# Altium schematic symbol library AA_Symbols.SchLib: 1017 symbols (part 5 of 7)
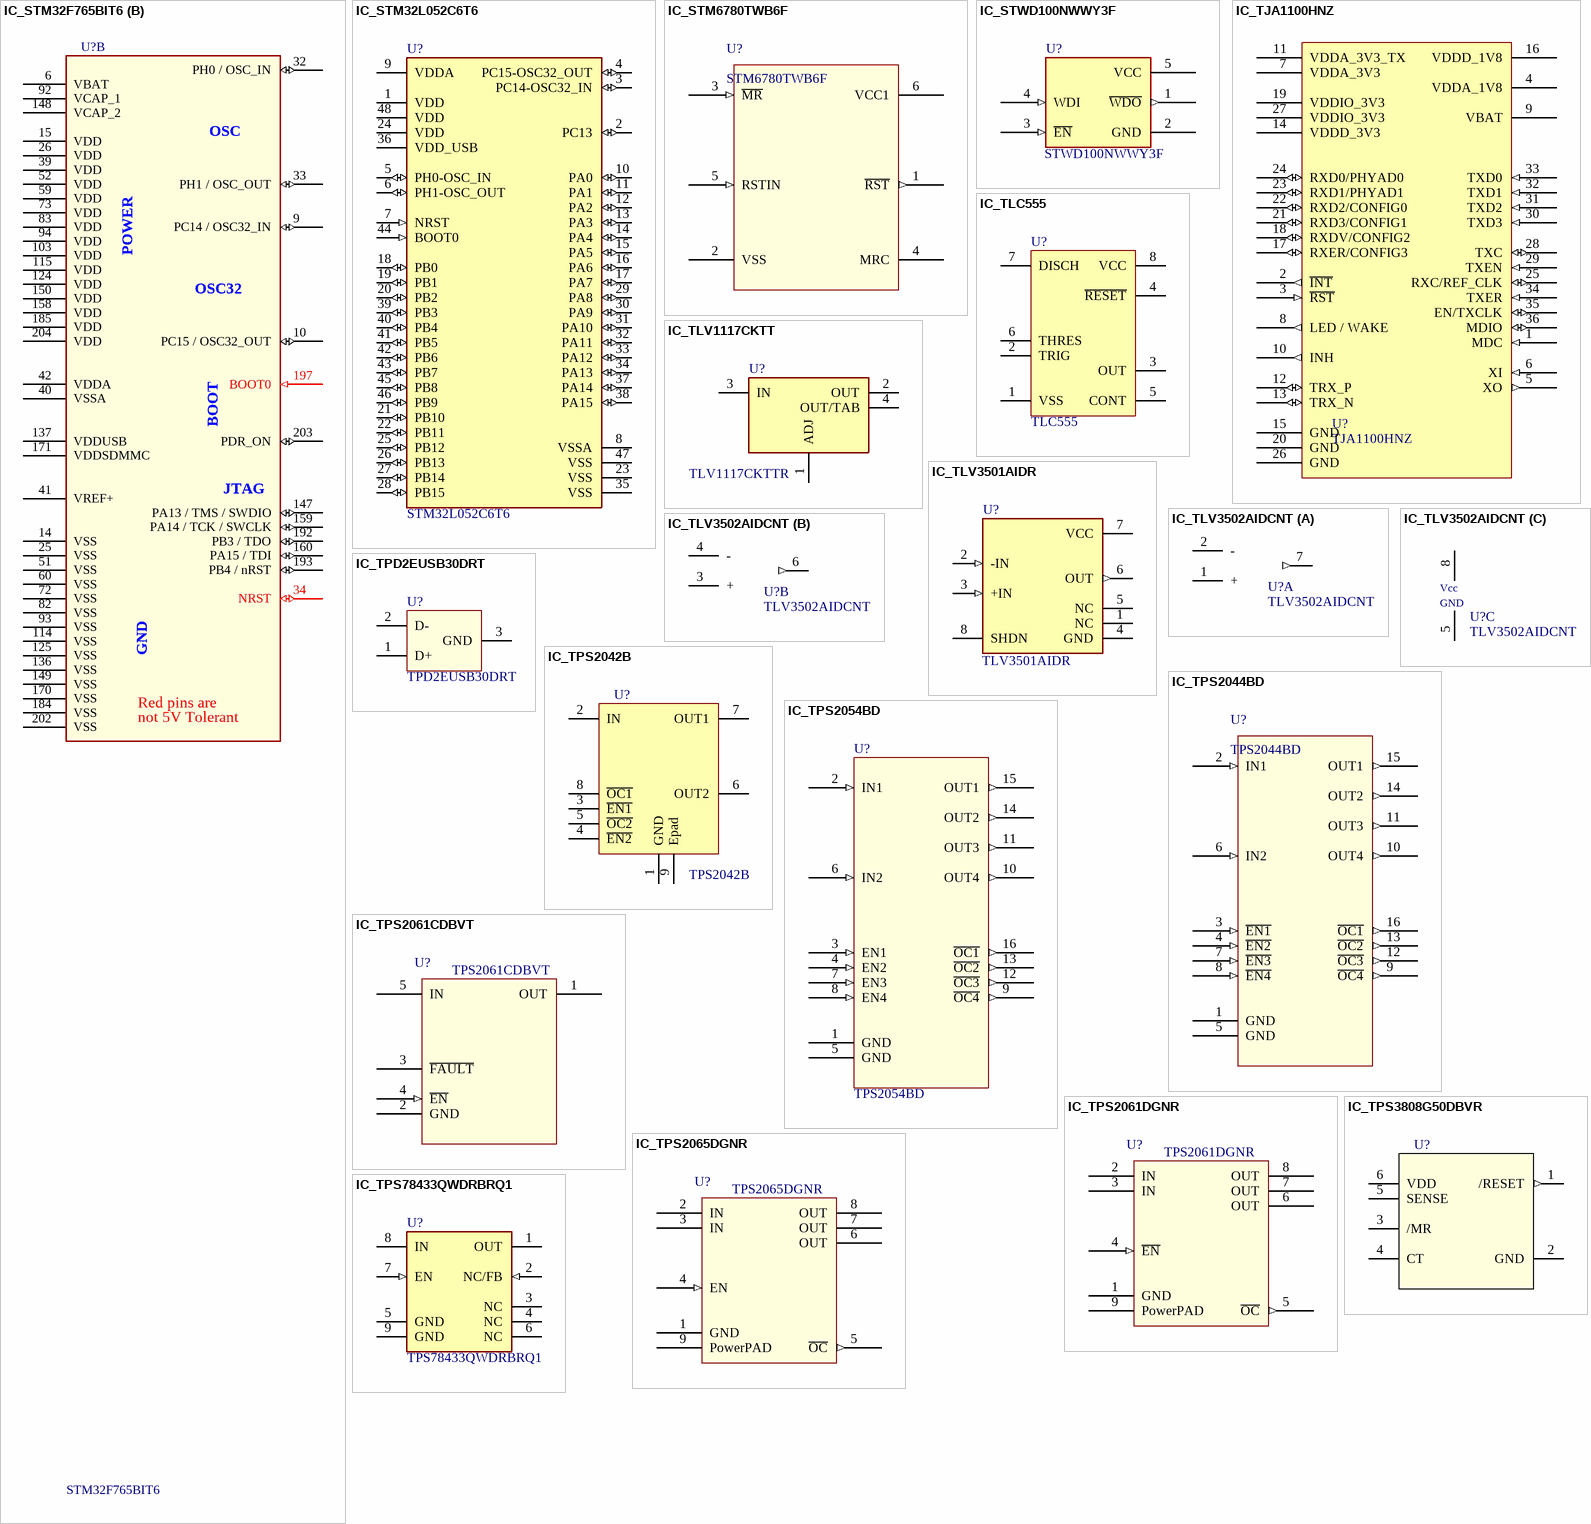
[diagram p46: symbols IC_STM32F765BIT6 to IC_TPS78433QWDRBRQ1]

## IC_STM32F765BIT6
designator U?, comment STM32F765BIT6
IC, STM32 ARM-based 32-bit MCU with 2MB Flash, 208LQFP, STM32F765BIT6; Manufacturer: STMicroelectronics; Outset P/N: PN-0006882; Manufacturer P/N: STM32F765BIT6; VALUE: STM32F765BIT6
footprint QFP208P50_3000X3000X160L60X22N
part A pins: 1 PE2 (io), 2 PE3 (io), 3 PE4 (io), 4 PE5 (io), 5 PE6 (io), 7 PI8 (io), 8 PC13 (io), 11 PI9 (io), 12 PI10 (io), 13 PI11 (io), 16 PF0 (io), 17 PF1 (io), 18 PF2 (io), 19 PI12 (io), 20 PI13 (io), 21 PI14 (io), 22 PF3 (io), 23 PF4 (io), 24 PF5 (io), 27 PF6 (io), 28 PF7 (io), 29 PF8 (io), 30 PF9 (io), 31 PF10 (io), 35 PC0 (io), 36 PC1 (io), 37 PC2 (io), 38 PC3 (io), 43 PA0 (io), 44 PA1 (io), 45 PA2 (io), 46 PH2 (io), 47 PH3 (io), 48 PH4 (io), 49 PH5 (io), 50 PA3 (io), 53 PA4 (io), 54 PA5 (io), 55 PA6 (io), 56 PA7 (io), 57 PC4 (io), 58 PC5 (io), 61 PB0 (io), 62 PB1 (io), 63 PB2 (io), 64 PI15 (io), 65 PJ0 (io), 66 PJ1 (io), 67 PJ2 (io), 68 PJ3 (io), 69 PJ4 (io), 70 PF11 (io), 71 PF12 (io), 74 PF13 (io), 75 PF14 (io), 76 PF15 (io), 77 PG0 (io), 78 PG1 (io), 79 PE7 (io), 80 PE8 (io), 81 PE9 (io), 84 PE10 (io), 85 PE11 (io), 86 PE12 (io), 87 PE13 (io), 88 PE14 (io), 89 PE15 (io), 90 PB10 (io), 91 PB11 (io), 95 PJ5 (io), 96 PH6 (io), 97 PH7 (io), 98 PH8 (io), 99 PH9 (io), 100 PH10 (io), 101 PH11 (io), 102 PH12 (io), 104 PB12 (io), 105 PB13 (io), 106 PB14 (io), 107 PB15 (io), 108 PD8 (io), 109 PD9 (io), 110 PD10 (io), 111 PD11 (io), 112 PD12 (io), 113 PD13 (io), 116 PD14 (io), 117 PD15 (io), 118 PJ6 (io), 119 PJ7 (io), 120 PJ8 (io), 121 PJ9 (io), 122 PJ10 (io), 123 PJ11 (io), 126 PK0 (io), 127 PK1 (io), 128 PK2 (io), 129 PG2 (io), 130 PG3 (io), 131 PG4 (io), 132 PG5 (io), 133 PG6 (io), 134 PG7 (io), 135 PG8 (io), 138 PC6 (io), 139 PC7 (io), 140 PC8 (io), 141 PC9 (io), 142 PA8 (io), 143 PA9 (io), 144 PA10 (io), 145 PA11 (io), 146 PA12 (io), 151 PH13 (io), 152 PH14 (io), 153 PH15 (io), 154 PI0 (io), 155 PI1 (io), 156 PI2 (io), 157 PI3 (io), 161 PC10 (io), 162 PC11 (io), 163 PC12 (io), 164 PD0 (io), 165 PD1 (io), 166 PD2 (io), 167 PD3 (io), 168 PD4 (io), 169 PD5 (io), 172 PD6 (io), 173 PD7 (io), 174 PJ12 (io), 175 PJ13 (io), 176 PJ14 (io), 177 PJ15 (io), 178 PG9 (io), 179 PG10 (io), 180 PG11 (io), 181 PG12 (io), 182 PG13 (io), 183 PG14 (io), 186 PK3 (io), 187 PK4 (io), 188 PK5 (io), 189 PK6 (io), 190 PK7 (io), 191 PG15 (io), 194 PB5 (io), 195 PB6 (io), 196 PB7 (io), 198 PB8 (io), 199 PB9 (io), 200 PE0 (io), 201 PE1 (io), 205 PI4 (io), 206 PI5 (io), 207 PI6 (io), 208 PI7 (io)
part B pins: 6 VBAT (power), 9 PC14 / OSC32_IN (io), 10 PC15 / OSC32_OUT (io), 14 VSS (power), 15 VDD (power), 25 VSS (power), 26 VDD (power), 32 PH0 / OSC_IN (io), 33 PH1 / OSC_OUT (io), 34 NRST (io), 39 VDD (power), 40 VSSA (power), 41 VREF+ (power), 42 VDDA (power), 51 VSS (power), 52 VDD (power), 59 VDD (power), 60 VSS (power), 72 VSS (power), 73 VDD (power), 82 VSS (power), 83 VDD (power), 92 VCAP_1 (power), 93 VSS (power), 94 VDD (power), 103 VDD (power), 114 VSS (power), 115 VDD (power), 124 VDD (power), 125 VSS (power), 136 VSS (power), 137 VDDUSB (power), 147 PA13 / TMS / SWDIO (io), 148 VCAP_2 (power), 149 VSS (power), 150 VDD (power), 158 VDD (power), 159 PA14 / TCK / SWCLK (io), 160 PA15 / TDI (io), 170 VSS (power), 171 VDDSDMMC (power), 184 VSS (power), 185 VDD (power), 192 PB3 / TDO (io), 193 PB4 / nRST (io), 197 BOOT0 (in), 202 VSS (power), 203 PDR_ON (io), 204 VDD (power)
part A text: Red pins are; not 5V Tolerant
part B text: OSC; POWER; OSC32; BOOT; JTAG; GND; Red pins are; not 5V Tolerant

## IC_STM32L052C6T6
designator U?, comment STM32L052C6T6
IC MCU 32BIT 32KB FLASH 48LQFP; Manufacturer: STMicro; Outset P/N: PN-0007909; TEMPERATURE: -40°C ~ 85°C; Manufacturer P/N: STM32L052C6T6; VALUE: STM32L052C6T6
footprint QFP48P50_900X900X160L60X22N
pins: 1 VDD (power), 2 PC13 (io), 3 PC14-OSC32_IN (io), 4 PC15-OSC32_OUT (io), 5 PH0-OSC_IN (io), 6 PH1-OSC_OUT (io), 7 NRST (in), 8 VSSA (power), 9 VDDA (power), 10 PA0 (io), 11 PA1 (io), 12 PA2 (io), 13 PA3 (io), 14 PA4 (io), 15 PA5 (io), 16 PA6 (io), 17 PA7 (io), 18 PB0 (io), 19 PB1 (io), 20 PB2 (io), 21 PB10 (io), 22 PB11 (io), 23 VSS (power), 24 VDD (power), 25 PB12 (io), 26 PB13 (io), 27 PB14 (io), 28 PB15 (io), 29 PA8 (io), 30 PA9 (io), 31 PA10 (io), 32 PA11 (io), 33 PA12 (io), 34 PA13 (io), 35 VSS (power), 36 VDD_USB (power), 37 PA14 (io), 38 PA15 (io), 39 PB3 (io), 40 PB4 (io), 41 PB5 (io), 42 PB6 (io), 43 PB7 (io), 44 BOOT0 (in), 45 PB8 (io), 46 PB9 (io), 47 VSS (power), 48 VDD (power)

## IC_STM6780TWB6F
designator U?, comment STM6780TWB6F
IC, Dual Voltage Monitor Supervisor, STM6780TWB6F, SOT23-6; Manufacturer: STMicroelectronics; Outset P/N: PN-0001653; Value: STM6780TWB6F; Manufacturer P/N: STM6780TWB6F
footprint STM6780TWB6F_SOT95P280X145-6L30N (Small Outline Transistor (SOT23), 0.95 mm pitch; 6 pin, 2.9 mm L X 1.6 mm W X 1.45 mm H body)
pins: 1 ~{RST} (out), 2 VSS (power), 3 ~{MR} (in), 4 MRC, 5 RSTIN (in), 6 VCC1 (power)

## IC_STWD100NWWY3F
designator U?, comment STWD100NWWY3F
IC, Supervisory Circuits Watchdog Timer, 1 CH, SOT23-5; Manufacturer: STMicroelectronics; Outset P/N: PN-0007146; Manufacturer P/N: STWD100NWWY3F; VALUE: STWD100NWWY3F
footprint SOT23-5P95_280X145L45X40N (527AH_MO-178)
pins: 1 ~{WDO} (out), 2 GND, 3 ~{EN} (in), 4 WDI (in), 5 VCC (power)

## IC_TJA1100HNZ
designator U?, comment TJA1100HNZ
IC, Transceiver Full Ethernet 36-HVQFN (6x6); Manufacturer: NXP USA Inc.; Manufacturer P/N: TJA1100HNZ
pins: 1 MDC (in), 2 ~{INT} (out), 3 ~{RST} (in), 4 VDDA_1V8 (power), 5 XO (out), 6 XI (in), 7 VDDA_3V3 (power), 8 LED / WAKE (out), 9 VBAT (power), 10 INH (out), 11 VDDA_3V3_TX (power), 12 TRX_P (io), 13 TRX_N (io), 14 VDDD_3V3 (power), 15 GND (power), 16 VDDD_1V8 (power), 17 RXER/CONFIG3 (io), 18 RXDV/CONFIG2 (io), 19 VDDIO_3V3 (power), 20 GND (power), 21 RXD3/CONFIG1 (io), 22 RXD2/CONFIG0 (io), 23 RXD1/PHYAD1 (io), 24 RXD0/PHYAD0 (io), 25 RXC/REF_CLK (io), 26 GND (power), 27 VDDIO_3V3 (power), 28 TXC (io), 29 TXEN (in), 30 TXD3 (in), 31 TXD2 (in), 32 TXD1 (in), 33 TXD0 (in), 34 TXER (in), 35 EN/TXCLK (io), 36 MDIO (io)

## IC_TLC555
designator U?, comment TLC555
IC, 555 timer, LinCMOS; Manufacturer: Texas Instruments; Manufacturer P/N: TLC555IDR; Outset P/N: 0000166
footprint SO-8N (SO8 8Pin)
pins: 1 VSS "CH A", 2 TRIG "VCC", 3 OUT "Mode", 4 ~{RESET} "Clock", 5 CONT "GND", 6 THRES "CH B", 7 DISCH "Up/Down", 8 VCC "BIAS"

## IC_TLV1117CKTT
designator U?, comment TLV1117CKTTR
IC, LDO Voltage Regulator Output 800mA Adj; Manufacturer: Texas Instruments; Outset P/N: PN-0007408; VALUE: TLV1117CKTTR; Manufacturer P/N: TLV1117CKTTR
footprint TO254P1524X445-4N (DDPAK_TO-263AA) (TO,2.54mm pitch; 2pin,15.24mm L X 10.16mm W X 4.45mm H body)
pins: 1 ADJ, 2 OUT (power), 3 IN (power), 4 OUT/TAB (power)

## IC_TLV3501AIDR
designator U?, comment TLV3501AIDR
IC, Comparator, 4.5ns, R-R Hi-Speed, 8-SOIC; Manufacturer: Texas Instruments; Outset P/N: PN-0007137; Manufacturer P/N: TLV3501AIDR; VALUE: TLV3501AIDR
footprint SOIC8P127_490X599X175L84X41N (D_MS-012AA)
pins: 1 NC, 2 -IN (in), 3 +IN (in), 4 GND (power), 5 NC, 6 OUT (out), 7 VCC (power), 8 SHDN

## IC_TLV3502AIDCNT
designator U?, comment TLV3502AIDCNT
IC, Comparator, Dual, Rail-to-Rail; Manufacturer: Texas Instruments; Outset P/N: 0000167; Manufacturer P/N: TLV3502AIDCNT
footprint SOT23_8PIN (SOT23, 8-Leads, Body 3.0x1.8mm (max), Pitch 0.65mm, IPC Medium Density)
part A pins: 1 +, 2 -, 7 OUT A (out)
part B pins: 3 +, 4 -, 6 OUT B (out)
part C pins: 5 Vcc- (power), 8 (power)
part C text: Vcc; GND

## IC_TPD2EUSB30DRT
designator U?, comment TPD2EUSB30DRT
IC, Diode, ESD Protection, USB, Dual; Manufacturer: Texas Instruments; Manufacturer P/N: TPD2EUSB30DRTR; Outset P/N: 0000168
footprint SOT-3
pins: 1 D+, 2 D-, 3 GND

## IC_TPS2042B
designator U?, comment TPS2042B
IC, Power Distribution Switch Dual; Manufacturer: Texas Instruments; Manufacturer P/N: TPS2042BDGNR; Outset P/N: 0000169
footprint MSOP_8PIN - PowerPad (MSOP, 8-Leads, Body 3.1x3.1mm (max), Pitch 0.65mm, IPC Medium Density)
pins: 1 GND, 2 IN, 3 ~{EN1}, 4 ~{EN2}, 5 ~{OC2}, 6 OUT2, 7 OUT1, 8 ~{OC1}, 9 Epad

## IC_TPS2044BD
designator U?, comment TPS2044BD
IC, Quad Power Distribution Switch, TPS2044BD, 16-SOIC; Manufacturer: Texas Instruments; Outset P/N: PN-0001654; Value: TPS2044BD; Manufacturer P/N: TPS2044BD
footprint TPS2044BD_SOIC127P600X175-8L87N (SOIC, 16-Leads, Body 9.90x3.90mm, Pitch 1.27mm, IPC Medium Density)
pins: 1 GND (power), 2 IN1 (in), 3 ~{EN1} (in), 4 ~{EN2} (in), 5 GND (power), 6 IN2 (in), 7 ~{EN3} (in), 8 ~{EN4} (in), 9 ~{OC4} (out), 10 OUT4 (out), 11 OUT3 (out), 12 ~{OC3} (out), 13 ~{OC2} (out), 14 OUT2 (out), 15 OUT1 (out), 16 ~{OC1} (out)

## IC_TPS2054BD
designator U?, comment TPS2054BD
IC, Quad Power Distribution Switch, TPS2054BD, 16-SOIC; Manufacturer: Texas Instruments; Manufacturer P/N: TPS2054BD; Value: TPS2054BD
footprint TPS2054BD_SOIC127P600X175-8L87N (Footprint not found)
pins: 1 GND (power), 2 IN1 (in), 3 EN1 (in), 4 EN2 (in), 5 GND (power), 6 IN2 (in), 7 EN3 (in), 8 EN4 (in), 9 ~{OC4} (out), 10 OUT4 (out), 11 OUT3 (out), 12 ~{OC3} (out), 13 ~{OC2} (out), 14 OUT2 (out), 15 OUT1 (out), 16 ~{OC1} (out)

## IC_TPS2061CDBVT
designator U?, comment TPS2061CDBVT
IC, Power Switch/Driver 1:1 N-Channel 1A SOT-23-5; Manufacturer: Texas Instruments; Outset P/N: PN-0008278; Value: TPS2061CDBVT; Manufacturer P/N: TPS2061CDBVT
footprint SOT23-5P95_280X145L45X40N (Small Outline Transistor, SOT-23 Type, 0.95 mm pitch; 5 pin, 2.90 mm L X 1.60 mm W X 1.45 mm H body)
pins: 1 OUT (power), 2 GND (power), 3 ~{FAULT} (power), 4 ~{EN} (in), 5 IN (power)

## IC_TPS2061DGNR
designator U?, comment TPS2061DGNR
IC, Single Power Distribution Switch 80mOhm, TPS2061DGNR, 8-MSOP; Manufacturer: Texas Instruments; Outset P/N: PN-0001655; Value: TPS2061DGNR; Manufacturer P/N: TPS2061DGNR
footprint TPS2061D_SOP65P490X110-8L30N (Plastic Small Outline Pkg (SOP with Tab), 0.65 mm pitch; 8 pin, 3.00 mm L X 3.00 mm W X 1.10 mm H body)
pins: 1 GND (power), 2 IN (power), 3 IN (power), 4 ~{EN} (in), 5 ~{OC} (out), 6 OUT (power), 7 OUT (power), 8 OUT (power), 9 PowerPAD

## IC_TPS2065DGNR
designator U?, comment TPS2065DGNR
IC, Single Power Distribution Switch 80mOhm, TPS2065DGNR, 8-MSOP; Manufacturer: Texas Instruments; Outset P/N: PN-0002777; Value: TPS2065DGNR; Manufacturer P/N: TPS2065DGNR
footprint TPS2065D_SOP65P490X110-8L30N (Footprint not found)
pins: 1 GND (power), 2 IN (power), 3 IN (power), 4 EN (in), 5 ~{OC} (out), 6 OUT (power), 7 OUT (power), 8 OUT (power), 9 PowerPAD

## IC_TPS3808G50DBVR
designator U?, comment TPS3808G50DBVR  (value not drawn)
IC, Power Monitor, TPS3808G50DBVR, SOT-23; Manufacturer: Texas Instruments; Outset P/N: PN-0001726; ClassName: *; Manufacturer P/N: TPS3808G50DBVR; NOSTUFF: *; Value: TPS3808G50DBVR
footprint MAX4173TEUT+T_SOT95P280X145-6L25N (Small Outline Transistor (SOT23), 0.95 mm pitch; 6 pin, 2.90 mm L X 1.625 mm W X 1.45 mm H body)
pins: 1 /RESET (out), 2 GND (power), 3 /MR, 4 CT, 5 SENSE, 6 VDD (power)

## IC_TPS78433QWDRBRQ1
designator U?, comment TPS78433QWDRBRQ1
IC, POS LDO, 3.3V FIXED, 300MA, 8-SON; Manufacturer: TI; Outset P/N: PN-0008342; TEMPERATURE: -40°C~ 150°C; Manufacturer P/N: TPS78433QWDRBRQ1; VALUE: TPS78433QWDRBRQ1
footprint TPS78433QWDRBRQ1
pins: 1 OUT (power), 2 NC/FB (in), 3 NC (hiz), 4 NC (hiz), 5 GND (power), 6 NC (hiz), 7 EN (in), 8 IN (power), 9 GND (power)

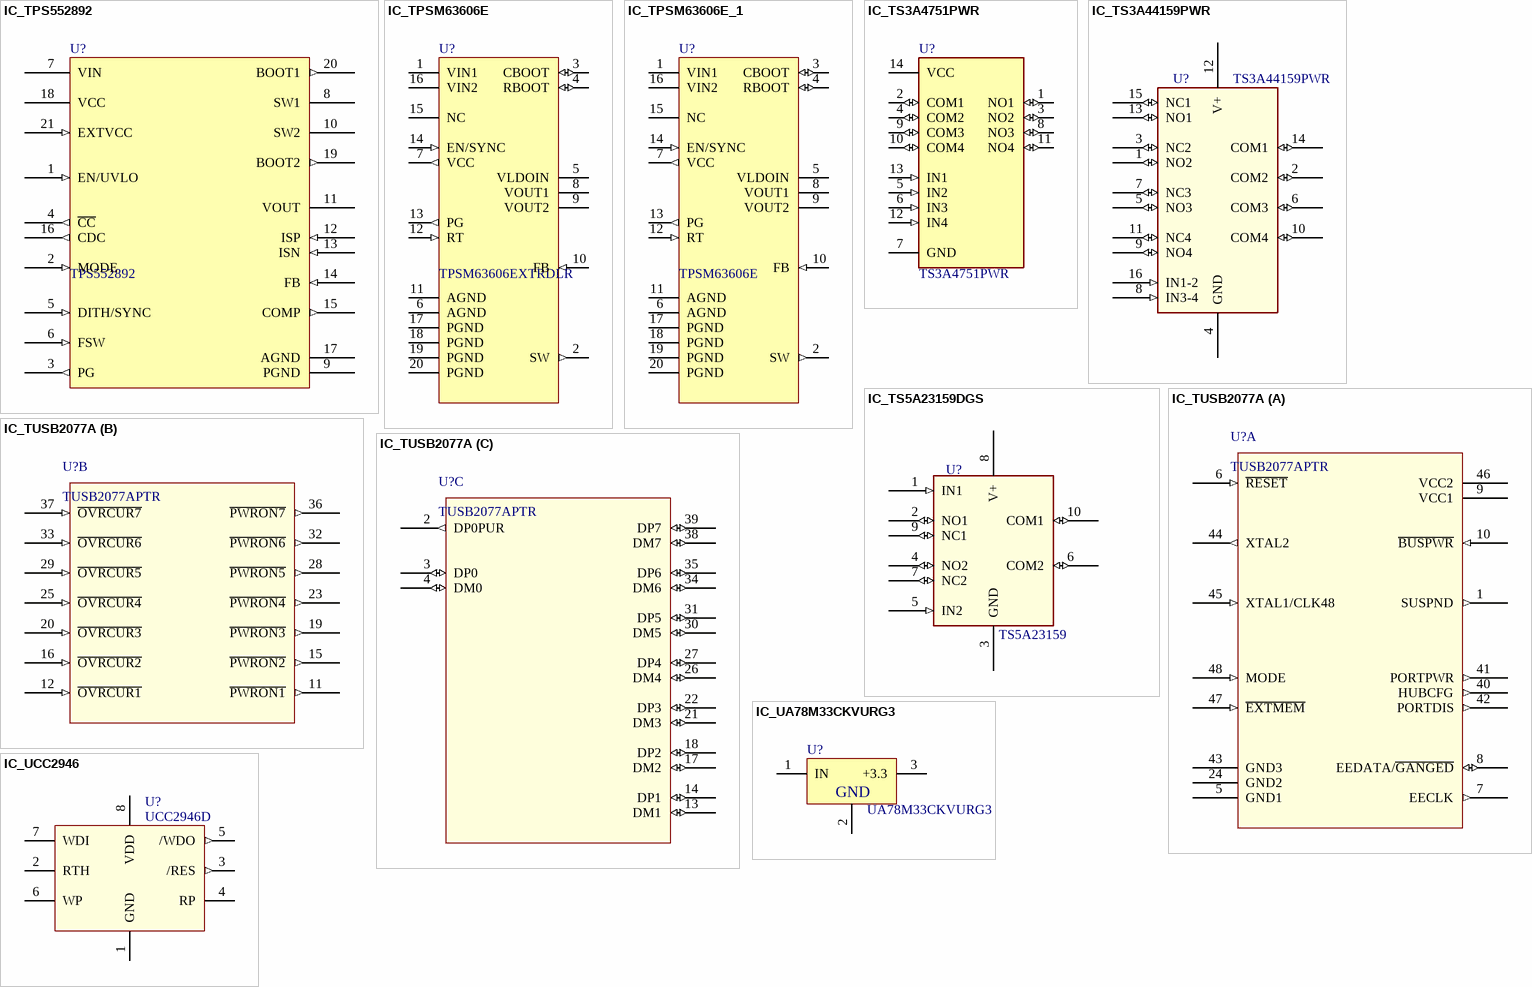
[diagram p27: symbols IC_TPS552892 to IC_UCC2946]

## IC_TPS552892
designator U?, comment TPS552892
IC,  36-V, 8-A, Fully Integrated Buck-boost Converter; Manufacturer: Texas Instruments; Manufacturer P/N: TPS552892RYQR; Value: TPS552892RYQR; Outset P/N: PN-0008172
footprint VQFN21_RYQ_TEX
pins: 1 EN/UVLO (in), 2 MODE (in), 3 PG (out), 4 ~{CC} (out), 5 DITH/SYNC (in), 6 FSW (in), 7 VIN (power), 8 SW1, 9 PGND (power), 10 SW2, 11 VOUT, 12 ISP (in), 13 ISN (in), 14 FB (in), 15 COMP (out), 16 CDC (out), 17 AGND (power), 18 VCC (power), 19 BOOT2 (out), 20 BOOT1 (out), 21 EXTVCC (in)

## IC_TPSM63606E
designator U?, comment TPSM63606EXTRDLR
IC, High-density, 36-V input, 1-V to 16-V output, 6-A power module with -55°C enhanced temperature range, QFN Package; Manufacturer: Texas Instruments; Outset P/N: PN-0008393; Manufacturer P/N: TPSM63606EXTRDLR; Value: TPSM63606EXTRDLR
footprint TI_TPSM63606E (Quad Flat No-Lead (QFN); 20 pin, 5.50 mm L X 5.00 mm W X 4.00 mm H body)
pins: 1 VIN1 (power), 2 SW (out), 3 CBOOT (io), 4 RBOOT (io), 5 VLDOIN (power), 6 AGND (power), 7 VCC (out), 8 VOUT1 (power), 9 VOUT2 (power), 10 FB (in), 11 AGND, 12 RT (in), 13 PG (out), 14 EN/SYNC (in), 15 NC, 16 VIN2 (power), 17 PGND (power), 18 PGND (power), 19 PGND (power), 20 PGND (power)

## IC_TPSM63606E_1
designator U?, comment TPSM63606E
IC, High-density, 36-V input, 1-V to 16-V output, 6-A power module with -55°C enhanced temperature range; Manufacturer: Texas Instruments; Manufacturer P/N: TPSM63606E
pins: 1 VIN1 (power), 2 SW (out), 3 CBOOT (io), 4 RBOOT (io), 5 VLDOIN (power), 6 AGND (power), 7 VCC (out), 8 VOUT1 (power), 9 VOUT2 (power), 10 FB (in), 11 AGND, 12 RT (in), 13 PG (out), 14 EN/SYNC (in), 15 NC, 16 VIN2 (power), 17 PGND (power), 18 PGND (power), 19 PGND (power), 20 PGND (power)

## IC_TS3A4751PWR
designator U?, comment TS3A4751PWR
IC, SWITCH QUAD SPST 14TSSOP; Manufacturer: Texas Instruments; Outset P/N: PN-0008330; TEMPERATURE: -40°C ~ 85°C; Manufacturer P/N: TS3A4751PWR; VALUE: TS3A4751PWR
footprint SOP14P65_500X640X120L62X24N (PW_MO-153)
pins: 1 NO1 (io), 2 COM1 (io), 3 NO2 (io), 4 COM2 (io), 5 IN2 (in), 6 IN3 (in), 7 GND (power), 8 NO3 (io), 9 COM3 (io), 10 COM4 (io), 11 NO4 (io), 12 IN4 (in), 13 IN1 (in), 14 VCC (power)

## IC_TS3A44159PWR
designator U?, comment TS3A44159PWR
IC, Analog Switch, Quad, SPDT; Manufacturer: Texas Instruments; Outset P/N: 0000171; Manufacturer P/N: TS3A44159PWR
footprint TSSOP_16PIN (TSSOP, 16-Leads, Body 5.1x4.5mm (max), Pitch 0.65mm, IPC Medium Density)
pins: 1 NO2 (io), 2 COM2 (io), 3 NC2 (io), 4 GND (power), 5 NO3 (io), 6 COM3 (io), 7 NC3 (io), 8 IN3-4 (in), 9 NO4 (io), 10 COM4 (io), 11 NC4 (io), 12 V+ (power), 13 NO1 (io), 14 COM1 (io), 15 NC1 (io), 16 IN1-2 (in)

## IC_TS5A23159DGS
designator U?, comment TS5A23159
IC, Analog Switch, Dual, SPDT; Manufacturer: Texas Instruments; Manufacturer P/N: TS5A23159DGSR; Outset P/N: 0000172
footprint MSOP_10PIN (MSOP, 10-Leads, Body 3.1x3.1mm (max), Pitch 0.50mm, IPC Medium Density)
pins: 1 IN1 (in), 2 NO1 (io), 3 GND (power), 4 NO2 (io), 5 IN2 (in), 6 COM2 (io), 7 NC2 (io), 8 V+ (power), 9 NC1 (io), 10 COM1 (io)

## IC_TUSB2077A
designator U?, comment TUSB2077APTR
IC, 7-Port USB Hub, TUSB2077A, PQFP-48; Manufacturer: Texas Instruments; Outset P/N: PN-0001656; Value: TUSB2077APTR; Manufacturer P/N: TUSB2077APTR
footprint TUSB2077A_QFP50P900X900X145-48L30N (Quad Flat Pack (QFP), 0.50 mm pitch; square, 12 pin X 12 pin, 7.00 mm L X 7.00 mm W X 1.45 mm H body)
part A pins: 1 SUSPND (out), 5 GND1 (power), 6 ~{RESET} (in), 7 EECLK (out), 8 EEDATA/~{GANGED} (io), 9 VCC1 (power), 10 ~{BUSPWR} (in), 24 GND2 (power), 40 HUBCFG (out), 41 PORTPWR (out), 42 PORTDIS (out), 43 GND3 (power), 44 XTAL2 (out), 45 XTAL1/CLK48 (in), 46 VCC2 (power), 47 ~{EXTMEM} (in), 48 MODE (in)
part B pins: 11 ~{PWRON1} (out), 12 ~{OVRCUR1} (in), 15 ~{PWRON2} (out), 16 ~{OVRCUR2} (in), 19 ~{PWRON3} (out), 20 ~{OVRCUR3} (in), 23 ~{PWRON4} (out), 25 ~{OVRCUR4} (in), 28 ~{PWRON5} (out), 29 ~{OVRCUR5} (in), 32 ~{PWRON6} (out), 33 ~{OVRCUR6} (in), 36 ~{PWRON7} (out), 37 ~{OVRCUR7} (in)
part C pins: 2 DP0PUR (out), 3 DP0 (io), 4 DM0 (io), 13 DM1 (io), 14 DP1 (io), 17 DM2 (io), 18 DP2 (io), 21 DM3 (io), 22 DP3 (io), 26 DM4 (io), 27 DP4 (io), 30 DM5 (io), 31 DP5 (io), 34 DM6 (io), 35 DP6 (io), 38 DM7 (io), 39 DP7 (io)

## IC_UA78M33CKVURG3
designator U?, comment UA78M33CKVURG3
IC, Voltage Regulator, 500mA, 3.3V, D2PAK; Manufacturer: Texas Instruments; Outset P/N: 0000173; Manufacturer P/N: UA78M33CKVURG3
footprint TO-252-3 (Voltage Regulator)
pins: 1 IN, 2 GND, 3 +3.3

## IC_UCC2946
designator U?, comment UCC2946D
IC, Watchdog; Manufacturer: Texas Instruments; Outset P/N: 0000174; Manufacturer P/N: UCC2946D
footprint SOIC_8PIN
pins: 1 GND (power), 2 RTH, 3 /RES (out), 4 RP, 5 /WDO (out), 6 WP, 7 WDI, 8 VDD (power)

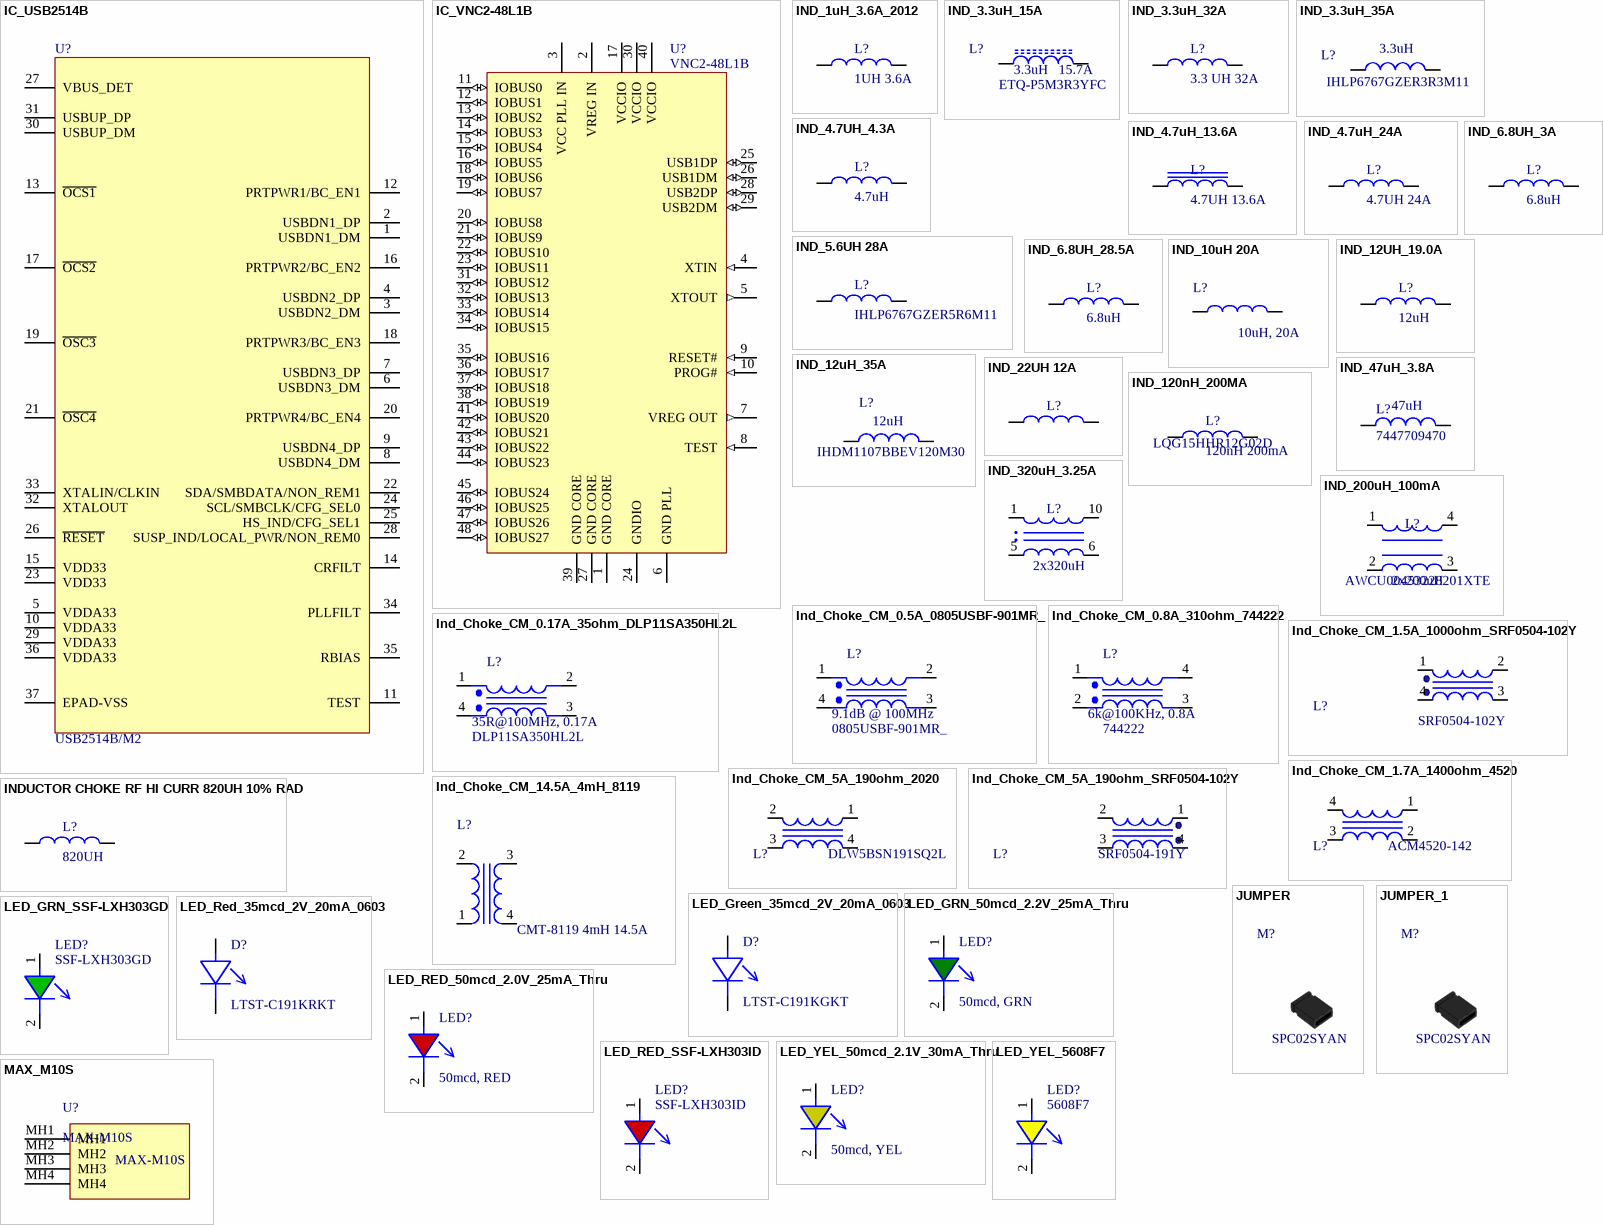
[diagram p28: symbols IC_USB2514B to MAX_M10S]

## IC_USB2514B
designator U?, comment USB2514B/M2
IC, 4-Port USB Hub, USB2514B, 36-QFN; Manufacturer: Microchip Technology; Outset P/N: PN-0002778; Manufacturer P/N: USB2514B/M2; Value: USB2514B/M2
footprint QFN_36PIN (QFN,0.50mm pitch,square;36 pin,6.00mm L X 6.00mm W X 1.00mm H body (w/thermal tab))
pins: 1 USBDN1_DM "CH A", 2 USBDN1_DP "CH A", 3 USBDN2_DM "CH A", 4 USBDN2_DP "CH A", 5 VDDA33 "CH A", 6 USBDN3_DM "CH A", 7 USBDN3_DP "CH A", 8 USBDN4_DM "CH A", 9 USBDN4_DP "CH A", 10 VDDA33 "CH A", 11 TEST "CH A", 12 PRTPWR1/BC_EN1 "CH A", 13 ~{OCS1} "CH A", 14 CRFILT "CH A", 15 VDD33 "CH A", 16 PRTPWR2/BC_EN2 "CH A", 17 ~{OCS2} "CH A", 18 PRTPWR3/BC_EN3 "CH A", 19 ~{OSC3} "CH A", 20 PRTPWR4/BC_EN4 "CH A", 21 ~{OSC4} "CH A", 22 SDA/SMBDATA/NON_REM1 "CH A", 23 VDD33 "CH A", 24 SCL/SMBCLK/CFG_SEL0 "CH A", 25 HS_IND/CFG_SEL1 "CH A", 26 ~{RESET} "CH A", 27 VBUS_DET "CH A", 28 SUSP_IND/LOCAL_PWR/NON_REM0 "CH A", 29 VDDA33 "CH A", 30 USBUP_DM "CH A", 31 USBUP_DP "CH A", 32 XTALOUT "CH A", 33 XTALIN/CLKIN "CH A", 34 PLLFILT "CH A", 35 RBIAS "CH A", 36 VDDA33 "CH A", 37 EPAD-VSS "CH A"

## IC_VNC2-48L1B
designator U?, comment VNC2-48L1B
IC, USB Host Controller, Dual, Vinculum-II, LQFP-48; Manufacturer: FTDI; Manufacturer P/N: VNC2-48L1B-REEL; Outset P/N: 0000175
footprint LQFP-48_N (Thin QFP, 48-Leads, Body 7x7mm, Pitch 0.5mm, IPC Medium Density)
pins: 1 GND CORE (power), 2 VREG IN (power), 3 VCC PLL IN (power), 4 XTIN (in), 5 XTOUT (out), 6 GND PLL (power), 7 VREG OUT (out), 8 TEST (in), 9 RESET# (in), 10 PROG# (in), 11 IOBUS0 (io), 12 IOBUS1 (io), 13 IOBUS2 (io), 14 IOBUS3 (io), 15 IOBUS4 (io), 16 IOBUS5 (io), 17 VCCIO (power), 18 IOBUS6 (io), 19 IOBUS7 (io), 20 IOBUS8 (io), 21 IOBUS9 (io), 22 IOBUS10 (io), 23 IOBUS11 (io), 24 GNDIO (power), 25 USB1DP (io), 26 USB1DM (io), 27 GND CORE (power), 28 USB2DP (io), 29 USB2DM (io), 30 VCCIO (power), 31 IOBUS12 (io), 32 IOBUS13 (io), 33 IOBUS14 (io), 34 IOBUS15 (io), 35 IOBUS16 (io), 36 IOBUS17 (io), 37 IOBUS18 (io), 38 IOBUS19 (io), 39 GND CORE (power), 40 VCCIO (power), 41 IOBUS20 (io), 42 IOBUS21 (io), 43 IOBUS22 (io), 44 IOBUS23 (io), 45 IOBUS24 (io), 46 IOBUS25 (io), 47 IOBUS26 (io), 48 IOBUS27 (io)

## IND_1uH_3.6A_2012
designator L?, comment 1UH 3.6A
Inductor, POWER 1UH 3.6A 2012; Manufacturer: Taiyo Yuden; Manufacturer P/N: NRS5020T1R0NMGJ; Outset P/N: 0000178; Value: 1UH
footprint RESC2012N (Chip Resistor, Body 2.0x1.3mm, IPC Medium Density)
pins: 1, 2

## IND_3.3uH_15A
designator L?, comment Manufacturer P/N: ETQ-P5M3R3YFC  Current Rating: 15.7A  (hidden comment: 3.3uH)
3.3 µH Shielded Drum Core, Wirewound Inductor 15.7 A 7.9mOhm Max,; Manufacturer: Panasonic Electronic Components; Outset P/N: PN-0008450; TYPE: Inductor; Temperature: -40C ~ 150C; VALUE: 3.3uH
footprint IND_PCC-M1054M (Panasonic  power inductor PCC-M1054M series)
pins: 1, 2

## IND_3.3uH_32A
designator L?, comment 3.3 UH 32A
Inductor, POWER 3.3UH 32.2A SMD; Manufacturer: Vishay/Dale; Manufacturer P/N: IHLP6767GZER3R3M51; Outset P/N: 0000181; Value: 3.3 UH
footprint INDUCTOR  17.15 x 17.15
pins: 1, 2

## IND_3.3uH_35A
designator L?, comment Manufacturer P/N: IHLP6767GZER3R3M11  (hidden comment: 3.3uH)
Inductor, 3.3uH, SMD, 20%, 35A, 2.93mOhm Max, Shielded Molded; Manufacturer: Vishay Dale; Outset P/N: PN-0007269; TYPE: Inductor; Temperature: -55C ~ 125C; VALUE: 3.3uH
footprint INDDFN2_1715X1715X700L382X1232N (Inductor, Dual Flat No-Lead, 2 pin; 17.15 mm L X 17.15 mm W X 7.00 mm H Body)
pins: 1, 2

## IND_4.7UH_4.3A
designator L?, comment 4.7uH
Inductor, 4.7uH, 4.3A; Manufacturer: CoilCraft; Manufacturer P/N: MSS1048-472NLD; Outset P/N: PN-0001790; Value: 4.7uH
footprint MSS1048-472NL_IND1020x1020x480_N (Inductor; 10.2 mm L X 10.2 mm W X 4.8 mm H body)
pins: 1, 2

## IND_4.7uH_13.6A
designator L?, comment 4.7UH 13.6A
Inductor, 4.7 µH Shielded Molded Inductor 13.6 A 14.26mOhm Max Nonstandard; Manufacturer: Coilcraft; Manufacturer P/N: XAL7070-472MEC; Outset P/N: PN-0008169; Value: 4.7 UH
footprint IND_COILCRAFT_XAL7070 (Shielded Inductor, SMT, Coilcraft)
pins: 1, 2

## IND_4.7uH_24A
designator L?, comment 4.7UH 24A
Indcutor, POWER 4.7UH 24A SMD; Manufacturer: Vishay/Dale; Manufacturer P/N: IHLP6767GZER4R7M51; Outset P/N: 0000182; Value: 4.7 UH
footprint INDUCTOR  17.15 x 17.15
pins: 1, 2

## IND_5.6UH 28A
designator L?, comment IHLP6767GZER5R6M11
Inductor, 5.6UH, 28A; Manufacturer: Vishay/Dale; Outset P/N: 0000183; Manufacturer P/N: IHLP6767GZER5R6M11
footprint INDUCTOR  17.15 x 17.15
pins: 1, 2

## IND_6.8UH_3A
designator L?, comment 6.8uH
Inductor, 6.8UH, 3A, 33mOhm; Manufacturer: Wurth Electronics; Manufacturer P/N: 744787068; Outset P/N: PN-0001782; Value: 6.8uH
footprint 744787068_IND_780X700X500_N (Inductor; 7.8mm L X 7.0mm W X 5 mm H body)
pins: 1, 2

## IND_6.8UH_28.5A
designator L?, comment 6.8uH
Inductor, 6.8UH, 28.5A; Manufacturer: Wurth Electronics; Manufacturer P/N: 74435580680; Outset P/N: PN-0001657; Value: 6.8uH
footprint 74435580680_IND2200x2250x1240_N (Inductor; 22.50 mm L X 22.10 mm W X 12.40 mm H body)
pins: 1, 2

## IND_10uH 20A
designator L?, comment 10uH, 20A
Inductor, 10uH, 20A, High Current Toroid; Manufacturer: Bourns Inc.; Manufacturer P/N: 2301-V-RC; Outset P/N: 0000177; Value: 10uH, 20A
footprint INDUCTOR  Toroid 2301 VERT
pins: 1, 2

## IND_12UH_19.0A
designator L?, comment 12uH
Inductor, 12UH, 19A; Manufacturer: Wurth Electronics; Manufacturer P/N: 74435581200; Outset P/N: PN-0001775; Value: 12uH
footprint 74435580680_IND2200x2250x1240_N (Inductor; 22.50 mm L X 22.10 mm W X 12.40 mm H body)
pins: 1, 2

## IND_12uH_35A
designator L?, comment Manufacturer P/N: IHDM1107BBEV120M30  (hidden comment: 12uH)
Inductor, 12µH, Thru Hole, 20%, 35A, 2.6mOhm Max, Wirewound, Unshielded Drum Core; Manufacturer: Vishay Dale; Outset P/N: PN-0007268; Temperature: -55C ~ 180C; VALUE: 12uH
footprint CAPRRO450W400L2680T1790H2240N (Radial (Dipped with Offset Leads), 4.50 mm Pitch X 4.00 mm W X 26.80 mm L X 17.90 mm T X 22.40 mm H Body)
pins: 1, 2

## IND_22UH 12A
designator L?, comment IHLP6767GZER220M11  (value not drawn)
Inductor, 22UH, 12A; Manufacturer: Vishay/Dale; Outset P/N: 0000179; Value: IHLP6767GZER220M11; Manufacturer P/N: IHLP6767GZER220M11
footprint INDUCTOR  17.15 x 17.15
pins: 1, 2

## IND_47uH_3.8A
designator L?, comment Manufacturer P/N: 7447709470  (hidden comment: 47uH)
Inductor, 47uH, SMD, 20%, 3.8A, 60mOhm Max, SMD, Wirewound; Manufacturer: Würth Elektronik; Outset P/N: PN-0007284; TOLERANCE: 20%; Temperature: -40C ~ 125C; VALUE: 47uH
footprint IND_7447709470_WRE-M
pins: 1, 2

## IND_120nH_200MA
designator L?, comment 120nH 200mA  Manufacturer P/N: LQG15HHR12G02D
Inductor, FIXED 120NH 200MA 1.3OHM SMD; Manufacturer: Murata Electronics; Value: 120nH; Supplier 1: Digi-Key; Supplier Part Number 1: 490-LQG15HHR12G02DCT-ND
pins: 1, 2

## IND_200uH_100mA
designator L?, comment 2x200uH  Manufacturer P/N: AWCU00453228201XTE
COMMON MODE CHOKE 200 µH @ 100 kHz 2 Line Common Mode Choke Surface Mount 100mA DCR 4.5Ohm; Manufacturer: Pulse Electronics; Value: 2x200uH; Supplier 1: Digi-Key; Supplier Part Number 1: 553-AWCU00453228201XTEDKR-ND
pins: 1, 2, 3, 4

## IND_320uH_3.25A
designator L?, comment 2x320uH
COMMON MODE CHOKE 3.25A 4 LN SMD; Manufacturer: Wurth Electronics; Manufacturer P/N: 744290321; Outset P/N: PN-0002180; Supplier 1: Digi-Key; Supplier Part Number 1: 732-5616-1-ND; Value: 2x320uH
footprint 744290321 (COMMON MODE CHOKE 3.25A 4 LN SMD)
pins: 1, 5, 6, 10

## Ind_Choke_CM_0.5A_0805USBF-901MR_
designator L?, comment Manufacturer P/N: 0805USBF-901MR_  (hidden comment: 9.1dB @ 100MHz)
Inductor, Choke, Common Mode, 500mA, >300Ohm @ >3GHz, 0805; Manufacturer: Coilcraft; Outset P/N: PN-0002782; Value: 9.1dB @ 100MHz
footprint 0805USBF (0805USBF; 4 pin, 2.03mm L X 1.27mm W X 1.4mm H)
pins: 1, 2, 3, 4
